# Altium footprint library ICs And Semiconductors SMD.PcbLib: 943 footprints (part 2 of 60)
Each footprint in its own frame and in the unit in brackets; x right, y up, seen from the top. Pads: shape width x height; smd on the part's side, far side on the other; paste and mask are expansions set on the pad; w line width, h text height; cw(c..) or ccw(c..) is an arc to the next point about the centre after c.
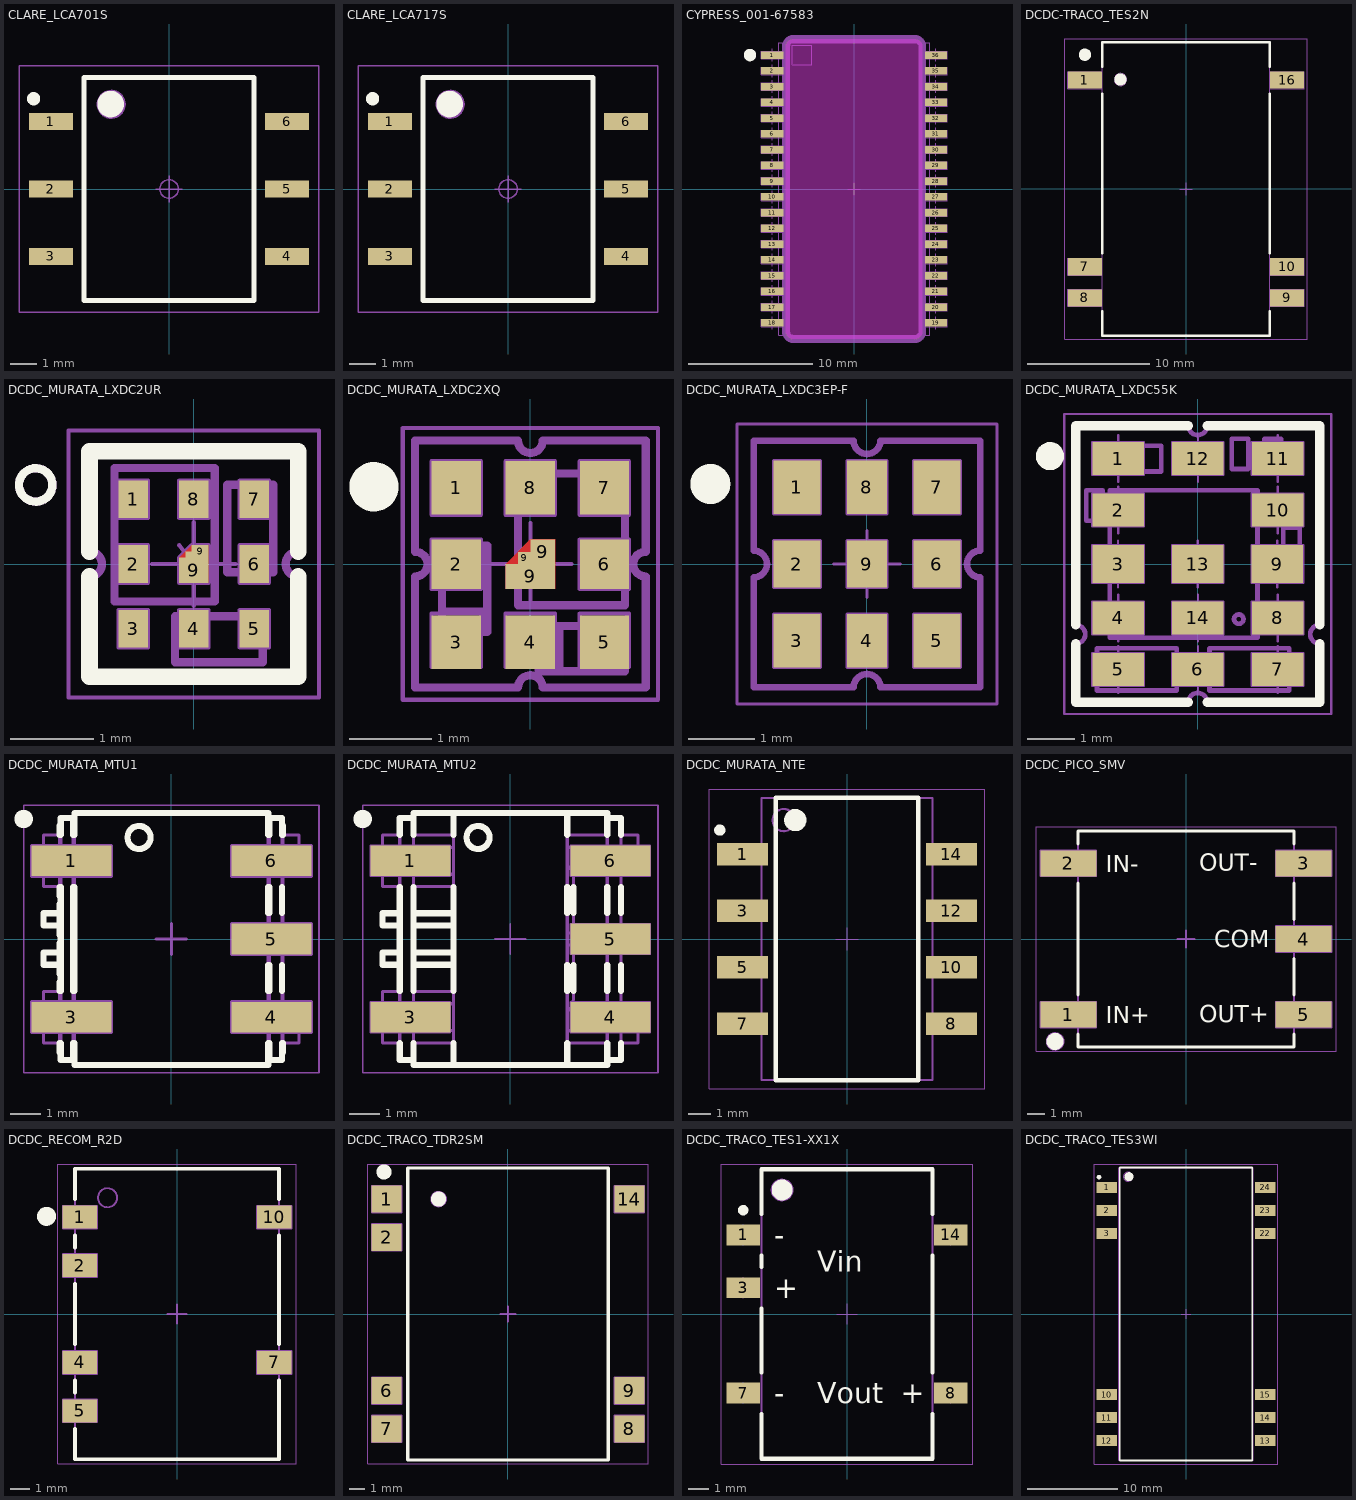
[diagram p1: the footprints below, top view; thin cyan lines are the x and y axes]

## CLARE_LCA701S [mm] "SOIC, 2.54mm, Pitch; 6 Pin, 6.35mm W X 8.382mm L X 4.699mm H body, CLARE LCA701S Serie"
height 4.69
pads (6):
  rect 1.65x0.65 smd: 1(-4.45,2.54) 2(-4.45,0) 3(-4.45,-2.54) 4(4.45,-2.54) 5(4.45,0) 6(4.45,2.54)
Top Overlay:
  circle w0.5: c-2.2,3.2 r0.25
  circle w0.25: c-5.1,3.4 r0.125
  lines w0.2: -3.2,-4.2 3.2,-4.2 3.2,4.2 -3.2,4.2 -3.2,-4.2
Mechanical 14:
  circle w0.1: c-2.175,3.191 r0.5
  lines w0.1: -3.175,-4.191 3.175,-4.191 3.175,4.191 -3.175,4.191 -3.175,-4.191
Mechanical 15:
  circle w0.05: c0,0 r0.35
  lines w0.05: -0.5,0 0.5,0 ; 0,-0.5 0,0.5 ; -5.65,-4.65 5.65,-4.65 5.65,4.65 -5.65,4.65 -5.65,-4.65
3D body "CLARE_LCA701S.stp": height 4.7, standoff 0, extent -5.052,-4.38 5.053,4.38

## CLARE_LCA717S [mm] "SOIC, 2.54mm, Pitch; 6 Pin, 6.35mm W X 8.382mm L X 4.699mm H body, CLARE LCA717S Serie"
height 4.69
pads (6):
  rect 1.65x0.65 smd: 1(-4.45,2.54) 2(-4.45,0) 3(-4.45,-2.54) 4(4.45,-2.54) 5(4.45,0) 6(4.45,2.54)
Top Overlay:
  circle w0.5: c-2.2,3.2 r0.25
  circle w0.25: c-5.1,3.4 r0.125
  lines w0.2: -3.2,-4.2 3.2,-4.2 3.2,4.2 -3.2,4.2 -3.2,-4.2
Mechanical 14:
  circle w0.1: c-2.175,3.191 r0.5
  lines w0.1: -3.175,-4.191 3.175,-4.191 3.175,4.191 -3.175,4.191 -3.175,-4.191
Mechanical 15:
  circle w0.05: c0,0 r0.35
  lines w0.05: -0.5,0 0.5,0 ; 0,-0.5 0,0.5 ; -5.65,-4.65 5.65,-4.65 5.65,4.65 -5.65,4.65 -5.65,-4.65
3D body "CLARE_LCA717S.stp": height 4.7, standoff 0, extent -5.052,-4.38 5.053,4.38

## CYPRESS_001-67583 [mm] "36-pin Ceramic Flat Pack (Solder Seal Lid) Package Outline 001-67583, Body 12.19mm X 23.37mm X 2.99mm H"
height 2.99
pads (36):
  rect 1.8x0.6 smd: 1(-6.6,10.795) 2(-6.6,9.525) 3(-6.6,8.255) 4(-6.6,6.985) 5(-6.6,5.715) 6(-6.6,4.445) 7(-6.6,3.175) 8(-6.6,1.905) 9(-6.6,0.635) 10(-6.6,-0.635) 11(-6.6,-1.905) 12(-6.6,-3.175) 13(-6.6,-4.445) 14(-6.6,-5.715) 15(-6.6,-6.985) 16(-6.6,-8.255) 17(-6.6,-9.525) 18(-6.6,-10.795) 19(6.6,-10.795) 20(6.6,-9.525) 21(6.6,-8.255) 22(6.6,-6.985) 23(6.6,-5.715) 24(6.6,-4.445) 25(6.6,-3.175) 26(6.6,-1.905) 27(6.6,-0.635) 28(6.6,0.635) 29(6.6,1.905) 30(6.6,3.175) 31(6.6,4.445) 32(6.6,5.715) 33(6.6,6.985) 34(6.6,8.255) 35(6.6,9.525) 36(6.6,10.795)
Top Overlay:
  circle w0.5: c-8.4,10.8 r0.25
Keep-Out Layer:
  board cut-out: -4.9,-12.1 -5.019,-12.1 -5.24,-12.009 -5.409,-11.84 -5.5,-11.619 -5.5,-11.5 -5.5,11.5 -5.5,11.619 -5.409,11.84 -5.24,12.009 -5.019,12.1 -4.9,12.1 4.9,12.1 5.019,12.1 5.24,12.009 5.409,11.84 5.5,11.619 5.5,11.5 5.5,-11.5 5.5,-11.619 5.409,-11.84 5.24,-12.009 5.019,-12.1 4.9,-12.1
Mechanical 1:
  lines w0.635: -5.5,-11.5 ccw(c-4.9,-11.5) -4.9,-12.1 4.9,-12.1 ccw(c4.9,-11.5) 5.5,-11.5 5.5,11.5 ccw(c4.9,11.5) 4.9,12.1 -4.9,12.1 ccw(c-4.9,11.5) -5.5,11.5 -5.5,-11.5
Mechanical 8:
  drawing of 292 lines, arcs and shapes, not listed
Mechanical 14:
  lines w0.1: -6.1,-11.8 6.1,-11.8 6.1,11.8 -6.1,11.8 -6.1,-11.8 ; -5,10.01 -5,11.61 -3.4,11.61 -3.4,10.01 -5,10.01
Drill Drawing:
  lines w0.1: -4.56,1.658 -5.5,2 ; -4.56,2.342 -5.5,2 ; -2.342,-11.16 -2,-12.1 ; -2.342,11.16 -2,12.1 ; -1.658,-11.16 -2,-12.1 ; -1.658,11.16 -2,12.1 ; -0.5,0 0,0 ; 0,-0.5 0,0 ; 0,0.5 0,0 ; 0.5,0 0,0 ; 1.115,-10.449 3.849,-10.449 5.3,-11.9 ; 4.394,-11.477 5.3,-11.9 ; 4.56,1.658 5.5,2 ; 4.56,2.342 5.5,2 ; 4.877,-10.994 5.3,-11.9 ; -5.5,2 5.5,2 ; -2,-12.1 -2,12.1 ; -5.5,-11.5 ccw(c-4.9,-11.5) -4.9,-12.1 4.9,-12.1 ccw(c4.9,-11.5) 5.5,-11.5 5.5,11.5 ccw(c4.9,11.5) 4.9,12.1 -4.9,12.1 ccw(c-4.9,11.5) -5.5,11.5 -5.5,-11.5
  text "11" at -0.516,2.209 h1
  text "24.2" at -2.209,2.903 h1
  text "r0.6" at 1.359,-10.239 h1
3D body "CYPRESS_001-67583.stp": height 2.5, standoff -0.49, extent -7,-11.81 7,11.81

## DCDC-TRACO_TES2N [mm] "TES 2 Series, DC/DC Converter,  Body 24x13.7mm"
height 8.25
pads (6):
  rect 2.8x1.4 smd: 1(-8.25,8.89) 7(-8.25,-6.35) 8(-8.25,-8.89) 9(8.25,-8.89) 10(8.25,-6.35) 16(8.25,8.89)
Top Overlay:
  circle w0.5: c-8.25,10.965 r0.25
  circle w0.5: c-5.35,8.94 r0.25
  lines w0.2: -6.85,-9.99 -6.85,-12 6.85,-12 6.85,-9.99 ; -6.85,-5.25 -6.85,7.79 ; -6.85,9.99 -6.85,12 6.85,12 6.85,9.99 ; 6.85,-5.25 6.85,7.79
Mechanical 8:
  lines w0.1: -8.75,-8.89 -8.25,-8.89 ; -8.75,-6.35 -8.25,-6.35 ; -8.75,8.89 -8.25,8.89 ; -8.25,-9.39 -8.25,-8.89 ; -8.25,-8.39 -8.25,-8.89 ; -8.25,-6.85 -8.25,-6.35 ; -8.25,-5.85 -8.25,-6.35 ; -8.25,8.39 -8.25,8.89 ; -8.25,9.39 -8.25,8.89 ; -7.75,-8.89 -8.25,-8.89 ; -7.75,-6.35 -8.25,-6.35 ; -7.75,8.89 -8.25,8.89 ; -0.5,0 0,0 ; 0,-0.5 0,0 ; 0,0.5 0,0 ; 0.5,0 0,0 ; 7.75,-8.89 8.25,-8.89 ; 7.75,-6.35 8.25,-6.35 ; 7.75,8.89 8.25,8.89 ; 8.25,-9.39 8.25,-8.89 ; 8.25,-8.39 8.25,-8.89 ; 8.25,-6.85 8.25,-6.35 ; 8.25,-5.85 8.25,-6.35 ; 8.25,8.39 8.25,8.89 ; 8.25,9.39 8.25,8.89 ; 8.75,-8.89 8.25,-8.89 ; 8.75,-6.35 8.25,-6.35 ; 8.75,8.89 8.25,8.89 ; -9.65,-9.59 -9.65,-8.19 -6.85,-8.19 -6.85,-9.59 -9.65,-9.59 ; -9.65,-7.05 -9.65,-5.65 -6.85,-5.65 -6.85,-7.05 -9.65,-7.05 ; -9.65,8.19 -9.65,9.59 -6.85,9.59 -6.85,8.19 -9.65,8.19 ; 6.85,-9.59 6.85,-8.19 9.65,-8.19 9.65,-9.59 6.85,-9.59 ; 6.85,-7.05 6.85,-5.65 9.65,-5.65 9.65,-7.05 6.85,-7.05 ; 6.85,8.19 6.85,9.59 9.65,9.59 9.65,8.19 6.85,8.19
Mechanical 14:
  circle w0.1: c-5.35,8.94 r0.5
  lines w0.1: -6.85,-9.39 -9.05,-9.39 -9.05,-8.39 -6.85,-8.39 ; -6.85,-6.85 -9.05,-6.85 -9.05,-5.85 -6.85,-5.85 ; -6.85,8.39 -9.05,8.39 -9.05,9.39 -6.85,9.39 ; 6.85,-9.39 9.05,-9.39 9.05,-8.39 6.85,-8.39 ; 6.85,-6.85 9.05,-6.85 9.05,-5.85 6.85,-5.85 ; 6.85,8.39 9.05,8.39 9.05,9.39 6.85,9.39 ; -6.85,-12 -6.85,12 6.85,12 6.85,-12 -6.85,-12
Mechanical 15:
  lines w0.05: -9.9,-12.25 -9.9,12.25 9.9,12.25 9.9,-12.25 -9.9,-12.25
3D body "DCDC-TRACO_TES2N.stp": height 8.45, standoff 0, extent -9.05,-12 9.05,12

## DCDC_MURATA_LXDC2UR [mm] "LGA, 9-Pin, Body 2.3mm x2.5mm, MURATA LXDC2UR Series"
height 1.2
pads (11):
  rect 0.35x0.45 smd: 1(-0.725,0.775) 2(-0.725,0) 3(-0.725,-0.775) 4(0,-0.775) 5(0.725,-0.775) 6(0.725,0) 7(0.725,0.775) 8(0,0.775)
  rect 0.075x0.075 smd: 9(-0.062,0.112)
  rect 0.35x0.3 smd: 9(0,-0.075)
  rect 0.2x0.15 smd: 9(0.075,0.15)
Top Layer:
  region: -0.175,0.075 -0.025,0.225 0.175,0.225 0.175,-0.225 -0.175,-0.225
Top Overlay:
  circle w0.1: c-1.894,0.947 r0.2
  lines w0.2: -1.25,-0.15 -1.25,-1.35 1.25,-1.35 1.25,-0.15 ; -1.25,0.15 -1.25,1.35 1.25,1.35 1.25,0.15
Mechanical 8:
  lines w0.05: -0.5,0 0,0 ; -0.175,0.225 0,0 ; -0.1,0.075 -0.1,0.15 -0.025,0.15 -0.062,0.112 -0.025,0.075 -0.025,0.225 ; 0,-0.5 0,0 ; 0,0.5 0,0 ; 0.5,0 0,0 ; -0.9,-1 -0.55,-1 -0.55,-0.55 -0.9,-0.55 ; -0.9,-1 -0.9,-0.55 ; -0.9,-1 -0.725,-0.775 -0.9,-0.55 ; -0.9,-0.225 -0.55,-0.225 -0.55,0.225 -0.9,0.225 ; -0.9,-0.225 -0.9,0.225 ; -0.9,-0.225 -0.725,0 -0.9,0.225 ; -0.9,0.55 -0.55,0.55 -0.55,1 -0.9,1 ; -0.9,0.55 -0.9,1 ; -0.9,0.55 -0.725,0.775 -0.9,1 ; -0.175,-1 0.175,-1 0.175,-0.55 -0.175,-0.55 ; -0.175,-1 -0.175,-0.55 ; -0.175,-1 0,-0.775 -0.175,-0.55 ; -0.175,-0.225 0.175,-0.225 ; -0.175,-0.225 -0.175,0.075 ; -0.175,-0.225 0,0 ; -0.175,0.075 -0.025,0.225 ; -0.175,0.075 0.175,0.075 ; -0.175,0.55 0.175,0.55 0.175,1 -0.175,1 ; -0.175,0.55 -0.175,1 ; -0.175,0.55 0,0.775 -0.175,1 ; -0.025,0.225 0.175,0.225 ; 0.175,-0.225 0.175,0.225 ; 0.175,-0.225 0,-0.075 0.175,0.075 ; 0.175,0.075 0.075,0.15 0.175,0.225 ; 0.55,-1 0.9,-1 0.9,-0.55 0.55,-0.55 ; 0.55,-1 0.55,-0.55 ; 0.55,-1 0.725,-0.775 0.55,-0.55 ; 0.55,-0.225 0.9,-0.225 0.9,0.225 0.55,0.225 ; 0.55,-0.225 0.55,0.225 ; 0.55,-0.225 0.725,0 0.55,0.225 ; 0.55,0.55 0.9,0.55 0.9,1 0.55,1 ; 0.55,0.55 0.55,1 ; 0.55,0.55 0.725,0.775 0.55,1
Mechanical 14:
  circle w0.1: c-1.894,0.947 r0.2
  lines w0.1: -1.25,-1.35 -1.25,-0.15 ccw(c-1.25,0) -1.25,0.15 -1.25,1.35 1.25,1.35 1.25,0.15 ccw(c1.25,0) 1.25,-0.15 1.25,-1.35 -1.25,-1.35 ; -0.95,-0.45 -0.95,1.15 0.25,1.15 0.25,-0.45 -0.95,-0.45 ; -0.225,-1.175 0.825,-1.175 0.825,-0.625 -0.225,-0.625 -0.225,-1.175 ; 0.4,-0.1 0.95,-0.1 0.95,0.95 0.4,0.95 0.4,-0.1
Mechanical 15:
  lines w0.05: -1.5,-1.6 1.5,-1.6 1.5,1.6 -1.5,1.6 -1.5,-1.6
3D body "DCDC_MURATA_LXDC2UR.stp": height 1.2, standoff 0, extent -1.25,-1.35 1.25,1.35

## DCDC_MURATA_LXDC2XQ [mm] "LGA, 9-Pin, Body 2.8mm x 2.6mm, MURATA LXDC2XQ Series"
height 1.14
pads (11):
  rect 0.6x0.65 smd: 1(-0.9,0.925) 3(-0.9,-0.95) 4(0,-0.95) 5(0.9,-0.95) 7(0.9,0.925) 8(0,0.925)
  rect 0.6x0.6 smd: 2(-0.9,0) 6(0.9,0)
  rect 0.15x0.15 smd: 9(-0.075,0.075)
  rect 0.6x0.3 smd: 9(0,-0.15)
  rect 0.3x0.3 smd: 9(0.15,0.15)
Top Layer:
  region: -0.3,-0.3 -0.3,0 0,0.3 0.3,0.3 0.3,-0.3
Top Overlay:
  circle w0.3: c-1.9,0.94 r0.15
Mechanical 8:
  lines w0.05: -0.5,0 0,0 ; 0,-0.5 0,0 ; 0,0.5 0,0 ; 0.5,0 0,0 ; -1.2,-1.25 -1.2,-0.6 -0.6,-0.6 -0.6,-1.25 ; -1.2,-1.25 -0.6,-1.25 ; -1.2,-1.25 -0.9,-0.925 -0.6,-1.25 ; -1.2,-0.3 -1.2,0.3 ; -1.2,-0.3 -0.6,-0.3 -0.6,0.3 -1.2,0.3 ; -1.2,-0.3 -0.9,0 -1.2,0.3 ; -1.2,1.25 -0.9,0.925 -0.6,1.25 ; -1.2,1.25 -0.6,1.25 ; -1.2,1.25 -1.2,0.6 -0.6,0.6 -0.6,1.25 ; -0.3,-1.25 -0.3,-0.6 0.3,-0.6 0.3,-1.25 ; -0.3,-1.25 0.3,-1.25 ; -0.3,-1.25 0,-0.925 0.3,-1.25 ; -0.3,1.25 0.3,1.25 ; -0.3,1.25 -0.3,0.6 0.3,0.6 0.3,1.25 ; -0.3,1.25 0,0.925 0.3,1.25 ; 0.6,1.25 1.2,1.25 ; 0.6,1.25 0.6,0.6 1.2,0.6 1.2,1.25 ; 0.6,1.25 0.9,0.925 1.2,1.25 ; 1.2,-1.25 0.9,-0.925 1.2,-0.6 ; 1.2,-1.25 0.6,-1.25 0.6,-0.6 1.2,-0.6 ; 1.2,-1.25 1.2,-0.6 ; 1.2,-0.3 0.9,0 1.2,0.3 ; 1.2,-0.3 0.6,-0.3 0.6,0.3 1.2,0.3 ; 1.2,-0.3 1.2,0.3
Mechanical 14:
  circle w0.1: c-1.894,0.947 r0.2
  lines w0.1: -1.075,-0.575 -0.525,-0.575 ; -1.075,-0.025 -0.525,-0.025 ; 0.35,-1.3 0.35,-0.75 ; 0.9,-1.3 0.9,-0.75 ; -1.4,-1.5 -0.15,-1.5 cw(c0,-1.5) 0.15,-1.5 1.4,-1.5 1.4,-0.15 cw(c1.4,0) 1.4,0.15 1.4,1.5 0.15,1.5 cw(c0,1.5) -0.15,1.5 -1.4,1.5 -1.4,0.15 cw(c-1.4,0) -1.4,-0.15 -1.4,-1.5 ; -1.075,-0.825 -0.525,-0.825 -0.525,0.225 -1.075,0.225 -1.075,-0.825 ; -0.15,-0.5 1.15,-0.5 1.15,1.1 -0.15,1.1 -0.15,-0.5 ; 0.1,-1.3 0.1,-0.75 1.15,-0.75 1.15,-1.3 0.1,-1.3
Mechanical 15:
  lines w0.05: -1.55,-1.647 -1.55,1.653 1.55,1.653 1.55,-1.647 -1.55,-1.647
3D body "DCDC_MURATA_LXDC2XQ.stp": height 1.15, standoff 0, extent -1.4,-1.5 1.4,1.5

## DCDC_MURATA_LXDC3EP-F [mm] "LGA, 9-Pin, Body 3.2mm x 3.5mm, MURATA LXDC3EP Type F Series"
height 1.3
pads (9):
  rect 0.7x0.8 smd: 1(-1.05,1.15) 3(-1.05,-1.15) 5(1.05,-1.15) 7(1.05,1.15)
  rect 0.7x0.7 smd: 2(-1.05,0) 6(1.05,0)
  rect 0.6x0.8 smd: 4(0,-1.15) 8(0,1.15)
  rect 0.6x0.7 smd: 9(0,0)
Top Overlay:
  circle w0.3: c-2.35,1.2 r0.15
Mechanical 8:
  lines w0.05: -0.5,0 0,0 ; 0,-0.5 0,0 ; 0,0.5 0,0 ; 0.5,0 0,0 ; -1.4,-1.55 -1.05,-1.15 -0.7,-1.55 ; -1.4,-1.55 -1.4,-0.75 -0.7,-0.75 -0.7,-1.55 ; -1.4,-1.55 -0.7,-1.55 ; -1.4,-0.35 -1.05,0 -1.4,0.35 ; -1.4,-0.35 -0.7,-0.35 -0.7,0.35 -1.4,0.35 ; -1.4,-0.35 -1.4,0.35 ; -1.4,1.55 -1.05,1.15 -0.7,1.55 ; -1.4,1.55 -0.7,1.55 ; -1.4,1.55 -1.4,0.75 -0.7,0.75 -0.7,1.55 ; -0.3,-1.55 0,-1.15 0.3,-1.55 ; -0.3,-1.55 -0.3,-0.75 0.3,-0.75 0.3,-1.55 ; -0.3,-1.55 0.3,-1.55 ; -0.3,-0.35 0,0 ; -0.3,-0.35 -0.3,0.35 ; -0.3,-0.35 0.3,-0.35 0.3,0.35 -0.3,0.35 ; -0.3,0.35 0,0 ; -0.3,1.55 0,1.15 0.3,1.55 ; -0.3,1.55 -0.3,0.75 0.3,0.75 0.3,1.55 ; -0.3,1.55 0.3,1.55 ; 0.7,-1.55 1.05,-1.15 1.4,-1.55 ; 0.7,-1.55 0.7,-0.75 1.4,-0.75 1.4,-1.55 ; 0.7,-1.55 1.4,-1.55 ; 0.7,1.55 1.05,1.15 1.4,1.55 ; 0.7,1.55 1.4,1.55 ; 0.7,1.55 0.7,0.75 1.4,0.75 1.4,1.55 ; 1.4,-0.35 1.05,0 1.4,0.35 ; 1.4,-0.35 0.7,-0.35 0.7,0.35 1.4,0.35 ; 1.4,-0.35 1.4,0.35
Mechanical 14:
  circle w0.1: c-2.35,1.2 r0.2
  lines w0.1: -1.7,-1.85 -0.2,-1.85 cw(c0,-1.85) 0.2,-1.85 1.7,-1.85 1.7,-0.2 cw(c1.7,0) 1.7,0.2 1.7,1.85 0.2,1.85 cw(c0,1.85) -0.2,1.85 -1.7,1.85 -1.7,0.2 cw(c-1.7,0) -1.7,-0.2 -1.7,-1.85
Mechanical 15:
  lines w0.05: -1.95,-2.1 1.95,-2.1 1.95,2.1 -1.95,2.1 -1.95,-2.1
3D body "DCDC_MURATA_LXDC3EP18F-F.stp": height 1.3, standoff 0, extent -1.7,-1.85 1.7,1.85

## DCDC_MURATA_LXDC55K [mm] "LGA, 14-Pin, Body 5.0mm x 5.7mm, MURATA LXDC55K Series"
height 2.1
pads (14):
  rect 1.1x0.7 smd: 1(-1.695,2.25) 2(-1.695,1.15) 4(-1.695,-1.15) 5(-1.695,-2.25) 6(0.005,-2.25) 7(1.705,-2.25) 8(1.705,-1.15) 10(1.705,1.15) 11(1.705,2.25) 12(0.005,2.25) 14(0.005,-1.15)
  rect 1.1x0.8 smd: 3(-1.7,0) 9(1.7,0) 13(0,0)
Top Overlay:
  circle w0.3: c-3.15,2.3 r0.15
  lines w0.2: -2.6,-1.7 -2.6,-2.95 -0.2,-2.95 ; -2.6,-1.3 -2.6,2.95 -0.2,2.95 ; 0.2,-2.95 2.6,-2.95 2.6,-1.7 ; 0.2,2.95 2.6,2.95 2.6,-1.3
Mechanical 8:
  lines w0.05: -2.2,0 -1.7,0 ; -2.195,-2.25 -1.695,-2.25 ; -2.195,-1.15 -1.695,-1.15 ; -2.195,1.15 -1.695,1.15 ; -2.195,2.25 -1.695,2.25 ; -1.7,-0.5 -1.7,0 ; -1.7,0.5 -1.7,0 ; -1.695,-2.75 -1.695,-2.25 ; -1.695,-1.75 -1.695,-2.25 ; -1.695,-1.65 -1.695,-1.15 ; -1.695,-0.65 -1.695,-1.15 ; -1.695,0.65 -1.695,1.15 ; -1.695,1.65 -1.695,1.15 ; -1.695,1.75 -1.695,2.25 ; -1.695,2.75 -1.695,2.25 ; -1.2,0 -1.7,0 ; -1.195,-2.25 -1.695,-2.25 ; -1.195,-1.15 -1.695,-1.15 ; -1.195,1.15 -1.695,1.15 ; -1.195,2.25 -1.695,2.25 ; -0.495,-2.25 0.005,-2.25 ; -0.495,-1.15 0.005,-1.15 ; -0.495,2.25 0.005,2.25 ; 0.005,-2.75 0.005,-2.25 ; 0.005,-1.75 0.005,-2.25 ; 0.005,-1.65 0.005,-1.15 ; 0.005,-0.65 0.005,-1.15 ; 0.005,1.75 0.005,2.25 ; 0.005,2.75 0.005,2.25 ; 0.505,-2.25 0.005,-2.25 ; 0.505,-1.15 0.005,-1.15 ; 0.505,2.25 0.005,2.25 ; 1.2,0 1.7,0 ; 1.205,-2.25 1.705,-2.25 ; 1.205,-1.15 1.705,-1.15 ; 1.205,1.15 1.705,1.15 ; 1.205,2.25 1.705,2.25 ; 1.7,-0.5 1.7,0 ; 1.7,0.5 1.7,0 ; 1.705,-2.75 1.705,-2.25 ; 1.705,-1.75 1.705,-2.25 ; 1.705,-1.65 1.705,-1.15 ; 1.705,-0.65 1.705,-1.15 ; 1.705,0.65 1.705,1.15 ; 1.705,1.65 1.705,1.15 ; 1.705,1.75 1.705,2.25 ; 1.705,2.75 1.705,2.25 ; 2.2,0 1.7,0 ; 2.205,-2.25 1.705,-2.25 ; 2.205,-1.15 1.705,-1.15 ; 2.205,1.15 1.705,1.15 ; 2.205,2.25 1.705,2.25 ; 0,0 0,-0.5 0,0 ; 0,0 -0.5,0 0,0 ; 0,0 0.5,0 0,0 ; 0,0 0,0.5 0,0 ; -2.25,-2.6 -2.25,-1.9 -1.15,-1.9 -1.15,-2.6 -2.25,-2.6 ; -2.25,-1.5 -2.25,-0.8 -1.15,-0.8 -1.15,-1.5 -2.25,-1.5 ; -2.25,-0.4 -1.15,-0.4 -1.15,0.4 -2.25,0.4 -2.25,-0.4 ; -2.25,0.8 -2.25,1.5 -1.15,1.5 -1.15,0.8 -2.25,0.8 ; -2.25,1.9 -2.25,2.6 -1.15,2.6 -1.15,1.9 -2.25,1.9 ; -0.55,-2.6 -0.55,-1.9 0.55,-1.9 0.55,-2.6 -0.55,-2.6 ; -0.55,-1.5 -0.55,-0.8 0.55,-0.8 0.55,-1.5 -0.55,-1.5 ; -0.55,-0.4 0.55,-0.4 0.55,0.4 -0.55,0.4 -0.55,-0.4 ; -0.55,1.9 -0.55,2.6 0.55,2.6 0.55,1.9 -0.55,1.9 ; 1.15,-2.6 1.15,-1.9 2.25,-1.9 2.25,-2.6 1.15,-2.6 ; 1.15,-1.5 1.15,-0.8 2.25,-0.8 2.25,-1.5 1.15,-1.5 ; 1.15,-0.4 2.25,-0.4 2.25,0.4 1.15,0.4 1.15,-0.4 ; 1.15,0.8 1.15,1.5 2.25,1.5 2.25,0.8 1.15,0.8 ; 1.15,1.9 1.15,2.6 2.25,2.6 2.25,1.9 1.15,1.9
Mechanical 14:
  circle w0.1: c-3.15,2.3 r0.2
  circle w0.1: c0.875,-1.175 r0.1
  lines w0.1: -2.6,-2.95 -0.2,-2.95 cw(c0,-2.95) 0.2,-2.95 2.6,-2.95 2.6,-1.7 cw(c2.6,-1.5) 2.6,-1.3 2.6,2.95 0.2,2.95 cw(c0,2.95) -0.2,2.95 -2.6,2.95 -2.6,-1.3 cw(c-2.6,-1.5) -2.6,-1.7 -2.6,-2.95 ; -2.375,0.925 -2.025,0.925 -2.025,1.575 -2.375,1.575 -2.375,0.925 ; -2.15,-2.7 -0.45,-2.7 -0.45,-1.8 -2.15,-1.8 -2.15,-2.7 ; -1.875,-1.575 1.275,-1.575 1.275,1.575 -1.875,1.575 -1.875,-1.575 ; -1.825,1.975 -0.775,1.975 -0.775,2.525 -1.825,2.525 -1.825,1.975 ; 0.25,-2.7 1.95,-2.7 1.95,-1.8 0.25,-1.8 0.25,-2.7 ; 0.725,2.025 0.725,2.675 1.075,2.675 1.075,2.025 0.725,2.025 ; 1.425,2.025 1.425,2.675 1.775,2.675 1.775,2.025 1.425,2.025 ; 1.52,1.13 2.175,1.13 2.17,1.48 1.52,1.48 1.52,1.13 ; 1.825,0.125 2.175,0.125 2.175,0.775 1.825,0.775 1.825,0.125
Mechanical 15:
  lines w0.05: -2.85,-3.2 2.85,-3.2 2.85,3.2 -2.85,3.2 -2.85,-3.2
3D body "DCDC_MURATA_LXDC55K.stp": height 2.1, standoff 0, extent -2.6,-2.95 2.6,2.95

## DCDC_MURATA_MTU1 [mm] "MTU1 Series, Body 8.2 x 8.4, Height 8.5mm"
height 8.5
pads (5):
  rect 2.6x1 smd: 1(-3.25,2.54) 3(-3.25,-2.54) 4(3.25,-2.54) 5(3.25,0) 6(3.25,2.54)
Top Overlay:
  circle w0.3: c-4.8,3.9 r0.15
  circle w0.2: c-1.05,3.3 r0.375
  lines w0.2: -3.634,-3.39 -3.634,-3.683 -3.592,-3.683 ; -3.634,-1.69 -3.634,-1.397 -3.592,-1.397 ; -3.634,-0.835 -4.15,-0.835 -4.15,-0.435 -3.634,-0.435 ; -3.634,0.435 -4.15,0.435 -4.15,0.835 -3.634,0.835 ; -3.634,1.69 -3.634,1.397 -3.592,1.397 ; -3.634,3.39 -3.634,3.683 -3.592,3.683 ; -3.592,-3.39 -3.592,-3.937 -3.192,-3.937 -3.192,-3.39 ; -3.592,-1.69 -3.592,1.69 ; -3.592,-1.143 -3.634,-1.143 -3.634,-0.127 -3.592,-0.127 ; -3.592,0.127 -3.634,0.127 -3.634,1.143 -3.592,1.143 ; -3.592,3.39 -3.592,3.937 -3.192,3.937 -3.192,3.39 ; -3.192,-1.69 -3.192,1.69 ; -3.15,-3.39 -3.15,-4.1 3.15,-4.1 3.15,-3.39 ; -3.15,-1.69 -3.15,1.69 ; -3.15,3.39 -3.15,4.1 3.15,4.1 3.15,3.39 ; 3.15,-1.69 3.15,-0.85 ; 3.15,0.85 3.15,1.69 ; 3.192,-3.39 3.192,-3.937 3.592,-3.937 3.592,-3.39 ; 3.192,-1.69 3.192,-0.85 ; 3.192,0.85 3.192,1.69 ; 3.192,3.39 3.192,3.937 3.592,3.937 3.592,3.39 ; 3.592,-3.683 3.634,-3.683 3.634,-3.39 ; 3.592,-1.69 3.592,-0.85 ; 3.592,0.85 3.592,1.69 ; 3.592,3.683 3.634,3.683 3.634,3.39
Mechanical 8:
  lines w0.05: -4.55,-2.04 -1.95,-2.04 ; -4.55,2.04 -1.95,2.04 ; -4.55,3.04 -1.95,3.04 ; 1.95,-3.04 4.55,-3.04 ; 1.95,-2.04 4.55,-2.04 ; 1.95,-0.5 4.55,-0.5 ; 1.95,0.5 4.55,0.5 ; 1.95,2.04 4.55,2.04 ; 1.95,3.04 4.55,3.04
  lines w0.1: -3.75,-2.54 -3.25,-2.54 ; -3.75,2.54 -3.25,2.54 ; -3.25,-3.04 -3.25,-2.54 ; -3.25,-2.04 -3.25,-2.54 ; -3.25,2.04 -3.25,2.54 ; -3.25,3.04 -3.25,2.54 ; -2.75,-2.54 -3.25,-2.54 ; -2.75,2.54 -3.25,2.54 ; 2.75,-2.54 3.25,-2.54 ; 2.75,0 3.25,0 ; 2.75,2.54 3.25,2.54 ; 3.25,-3.04 3.25,-2.54 ; 3.25,-2.04 3.25,-2.54 ; 3.25,-0.5 3.25,0 ; 3.25,0.5 3.25,0 ; 3.25,2.04 3.25,2.54 ; 3.25,3.04 3.25,2.54 ; 3.75,-2.54 3.25,-2.54 ; 3.75,0 3.25,0 ; 3.75,2.54 3.25,2.54 ; 0,0 0,0.5 0,0 ; 0,0 0.5,0 0,0 ; 0,0 -0.5,0 0,0 ; 0,0 0,-0.5 0,0 ; -4.55,-3.04 -1.95,-3.04 -1.95,-2.04 -4.55,-2.04 -4.55,-3.04 ; -4.55,2.04 -1.95,2.04 -1.95,3.04 -4.55,3.04 -4.55,2.04 ; 1.95,-3.04 4.55,-3.04 4.55,-2.04 1.95,-2.04 1.95,-3.04 ; 1.95,-0.5 1.95,0.5 4.55,0.5 4.55,-0.5 1.95,-0.5 ; 1.95,2.04 4.55,2.04 4.55,3.04 1.95,3.04 1.95,2.04
Mechanical 14:
  circle w0.1: c-1.05,3.3 r0.375
  lines w0.1: -3.634,-3.375 -4.15,-3.375 -4.15,-2.975 -3.634,-2.975 ; -3.634,-2.84 -4.2,-2.84 -4.2,-2.24 -3.634,-2.24 ; -3.634,-2.74 -4.13,-2.74 -4.13,-2.34 -3.634,-2.34 ; -3.634,-2.105 -4.15,-2.105 -4.15,-1.705 -3.634,-1.705 ; -3.634,-0.835 -4.15,-0.835 -4.15,-0.435 -3.634,-0.435 ; -3.634,0.435 -4.15,0.435 -4.15,0.835 -3.634,0.835 ; -3.634,1.705 -4.15,1.705 -4.15,2.105 -3.634,2.105 ; -3.634,2.24 -4.2,2.24 -4.2,2.84 -3.634,2.84 ; -3.634,2.74 -4.13,2.74 -4.13,2.34 -3.63,2.34 ; -3.634,2.975 -4.15,2.975 -4.15,3.375 -3.634,3.375 ; -3.592,-3.683 -3.634,-3.683 -3.634,-1.397 -3.592,-1.397 ; -3.592,-1.143 -3.634,-1.143 -3.634,-0.127 -3.592,-0.127 ; -3.592,0.127 -3.634,0.127 -3.634,1.143 -3.592,1.143 ; -3.592,1.397 -3.634,1.397 -3.634,3.683 -3.592,3.683 ; 3.592,-3.683 3.634,-3.683 3.634,-1.778 3.592,-1.778 ; 3.592,-0.762 3.634,-0.762 3.634,0.762 3.592,0.762 ; 3.592,1.778 3.634,1.778 3.634,3.683 3.592,3.683 ; 3.63,-2.34 4.13,-2.34 4.13,-2.74 3.634,-2.74 ; 3.63,-0.2 4.15,-0.2 4.15,0.2 3.63,0.2 ; 3.63,2.74 4.13,2.74 4.13,2.34 3.634,2.34 ; 3.634,-3.375 4.15,-3.375 4.15,-2.975 3.634,-2.975 ; 3.634,-2.84 4.2,-2.84 4.2,-2.24 3.634,-2.24 ; 3.634,-0.3 4.2,-0.3 4.2,0.3 3.634,0.297 ; 3.634,2.24 4.2,2.24 4.2,2.84 3.634,2.84 ; 3.634,2.975 4.15,2.975 4.15,3.375 3.634,3.375 ; -3.592,-3.937 -3.592,3.937 -3.192,3.937 -3.192,-3.937 -3.592,-3.937 ; -3.15,-4.1 3.15,-4.1 3.15,4.1 -3.15,4.1 -3.15,-4.1 ; 3.192,-3.937 3.592,-3.937 3.592,3.937 3.192,3.937 3.192,-3.937
Mechanical 15:
  lines w0.05: -4.8,-4.35 4.8,-4.35 4.8,4.35 -4.8,4.35 -4.8,-4.35
3D body "DCDC_MURATA_MTU1.stp": height 8.5, standoff 0, extent -4.2,-4.1 4.2,4.1

## DCDC_MURATA_MTU2 [mm] "MTU2 Series, Body 8.2 x 8.4, Height 8.5mm"
height 8.5
pads (5):
  rect 2.6x1 smd: 1(-3.25,2.54) 3(-3.25,-2.54) 4(3.25,-2.54) 5(3.25,0) 6(3.25,2.54)
Top Overlay:
  circle w0.2: c-1.05,3.3 r0.375
  circle w0.3: c-4.8,3.9 r0.15
  lines w0.2: -3.592,-3.39 -3.592,-3.937 -3.15,-3.937 ; -3.592,-1.69 -3.592,1.69 ; -3.592,-0.835 -4.15,-0.835 -4.15,-0.435 -3.592,-0.435 ; -3.592,0.435 -4.15,0.435 -4.15,0.835 -3.592,0.835 ; -3.592,3.39 -3.592,3.937 -3.15,3.937 ; -3.15,-3.39 -3.15,-4.1 3.15,-4.1 3.15,-3.39 ; -3.15,-1.69 -3.15,1.69 ; -3.15,-0.835 -1.85,-0.835 ; -3.15,-0.435 -1.85,-0.435 ; -3.15,0.435 -1.85,0.435 ; -3.15,0.835 -1.85,0.835 ; -3.15,3.39 -3.15,4.1 3.15,4.1 3.15,3.39 ; -1.85,-4.1 -1.85,-3.39 ; -1.85,-1.69 -1.85,1.69 ; -1.85,3.39 -1.85,4.1 ; 1.85,-4.1 1.85,-3.39 ; 1.85,-1.69 1.85,-0.85 ; 1.85,0.85 1.85,1.69 ; 1.85,3.39 1.85,4.1 ; 2.05,-1.69 2.05,-0.85 ; 2.05,0.85 2.05,1.69 ; 3.15,-3.937 3.592,-3.937 3.592,-3.39 ; 3.15,-1.69 3.15,-0.85 ; 3.15,0.85 3.15,1.69 ; 3.15,3.937 3.592,3.937 3.592,3.39 ; 3.592,-1.69 3.592,-0.85 ; 3.592,0.85 3.592,1.69
Mechanical 8:
  lines w0.05: -3.75,-2.54 -3.25,-2.54 ; -3.75,2.54 -3.25,2.54 ; -3.25,-3.04 -3.25,-2.54 ; -3.25,-2.04 -3.25,-2.54 ; -3.25,2.04 -3.25,2.54 ; -3.25,3.04 -3.25,2.54 ; -2.75,-2.54 -3.25,-2.54 ; -2.75,2.54 -3.25,2.54 ; -0.5,0 0,0 ; 0,-0.5 0,0 ; 0,0.5 0,0 ; 0.5,0 0,0 ; 2.75,-2.54 3.25,-2.54 ; 2.75,0 3.25,0 ; 2.75,2.54 3.25,2.54 ; 3.25,-3.04 3.25,-2.54 ; 3.25,-2.04 3.25,-2.54 ; 3.25,-0.5 3.25,0 ; 3.25,0.5 3.25,0 ; 3.25,2.04 3.25,2.54 ; 3.25,3.04 3.25,2.54 ; 3.75,-2.54 3.25,-2.54 ; 3.75,0 3.25,0 ; 3.75,2.54 3.25,2.54 ; -4.55,-3.04 -4.55,-2.04 -1.95,-2.04 -1.95,-3.04 -4.55,-3.04 ; -4.55,2.04 -1.95,2.04 -1.95,3.04 -4.55,3.04 -4.55,2.04 ; 1.95,-3.04 1.95,-2.04 4.55,-2.04 4.55,-3.04 1.95,-3.04 ; 1.95,-0.5 1.95,0.5 4.55,0.5 4.55,-0.5 1.95,-0.5 ; 1.95,2.04 1.95,3.04 4.55,3.04 4.55,2.04 1.95,2.04
Mechanical 14:
  circle w0.1: c-1.05,3.3 r0.375
  lines w0.1: -3.592,-3.375 -4.15,-3.375 -4.15,-2.975 -3.592,-2.975 ; -3.592,-2.84 -4.2,-2.84 -4.2,-2.24 -3.592,-2.24 ; -3.592,-2.105 -4.15,-2.105 -4.15,-1.705 -3.592,-1.705 ; -3.592,-0.835 -4.15,-0.835 -4.15,-0.435 -3.592,-0.435 ; -3.592,0.435 -4.15,0.435 -4.15,0.835 -3.592,0.835 ; -3.592,1.705 -4.15,1.705 -4.15,2.105 -3.592,2.105 ; -3.592,2.24 -4.2,2.24 -4.2,2.84 -3.592,2.84 ; -3.592,2.975 -4.15,2.975 -4.15,3.375 -3.592,3.375 ; -3.15,-3.937 -3.592,-3.937 -3.592,3.937 -3.15,3.937 ; -3.15,-3.375 -1.85,-3.375 ; -3.15,-2.975 -1.85,-2.975 ; -3.15,-2.105 -1.85,-2.105 ; -3.15,-1.705 -1.85,-1.705 ; -3.15,-0.835 -1.85,-0.835 ; -3.15,-0.435 -1.85,-0.435 ; -3.15,0.435 -1.85,0.435 ; -3.15,0.835 -1.85,0.835 ; -3.15,1.705 -1.85,1.705 ; -3.15,2.105 -1.85,2.105 ; -3.15,2.975 -1.85,2.975 ; -3.15,3.375 -1.85,3.375 ; -1.85,-4.1 -1.85,4.1 ; 1.85,-4.1 1.85,4.1 ; 1.85,-3.375 3.15,-3.375 ; 1.85,-2.975 3.15,-2.975 ; 1.85,-2.353 ccw(c1.55,-1.953) 2.05,-1.953 2.05,-0.2 ; 1.85,-0.2 3.15,-0.2 ; 1.85,0.2 3.15,0.2 ; 1.85,2.377 cw(c1.55,1.977) 2.05,1.977 2.05,0.2 ; 1.85,2.975 3.15,2.975 ; 1.85,3.375 3.15,3.375 ; 3.15,-3.937 3.592,-3.937 3.592,3.937 3.15,3.937 ; 3.592,-3.375 4.15,-3.375 4.15,-2.975 3.592,-2.975 ; 3.592,-2.84 4.2,-2.84 4.2,-2.24 3.592,-2.24 ; 3.592,-0.3 4.2,-0.3 4.2,0.3 3.592,0.3 ; 3.592,2.24 4.2,2.24 4.2,2.84 3.592,2.84 ; 3.592,2.975 4.15,2.975 4.15,3.375 3.592,3.375 ; -3.15,-4.1 -3.15,4.1 3.15,4.1 3.15,-4.1 -3.15,-4.1
Mechanical 15:
  lines w0.05: -4.8,-4.35 4.8,-4.35 4.8,4.35 -4.8,4.35 -4.8,-4.35
3D body "DCDC_MURATA_MTU2.stp": height 8.5, standoff 0, extent -4.2,-4.1 4.2,4.1

## DCDC_MURATA_NTE [mm] "SOIC, 2.54mm,pitch; 8 pin, 7.70mm W X 12.70mm L X 6.60mm H body, IPC Medium Density"
height 6.6
pads (8):
  rect 2.3x1 smd: 1(-4.7,3.81) 3(-4.7,1.27) 5(-4.7,-1.27) 7(-4.7,-3.81) 8(4.7,-3.81) 10(4.7,-1.27) 12(4.7,1.27) 14(4.7,3.81)
Top Overlay:
  circle w0.25: c-5.725,4.9 r0.125
  circle w0.5: c-2.325,5.35 r0.25
  lines w0.2: -3.2,-6.35 -3.2,6.35 3.2,6.35 3.2,-6.35 -3.2,-6.35
Mechanical 14:
  circle w0.1: c-2.85,5.35 r0.5
  lines w0.1: -3.85,-6.35 -3.85,6.35 3.85,6.35 3.85,-6.35 -3.85,-6.35
Mechanical 15:
  lines w0.05: -0.5,0 0.5,0 ; 0,-0.5 0,0.5 ; -6.2,-6.75 -6.2,6.75 6.2,6.75 6.2,-6.75 -6.2,-6.75
3D body "DCDC_MURATA_NTE.stp": height 6.6, standoff 0, extent -5.626,-6.475 5.626,6.475

## DCDC_PICO_SMV [mil] "SMV Series, SMD DC/DC Converter,  Body 12.7x12.7mm"
height 439.76
pads (5):
  rect 130x60 smd: 1(-272.5,-175) 2(-272.5,175) 3(272.5,175) 4(272.5,0) 5(272.5,-175)
Top Overlay:
  circle w19.68: c-303.15,-237.21 r9.84
  lines w7.87: -250,-220.75 -250,-250 250,-250 250,-220.75 ; -250,-129.25 -250,129.25 ; -250,220.75 -250,250 250,250 250,220.75 ; 250,-129.25 250,-45.75 ; 250,45.75 250,129.25
  text "IN+" at -185.48,-195.28 h39.37
  text "IN-" at -185.48,154.72 h39.37
  text "OUT-" at 31.05,157.68 h39.37
  text "OUT+" at 31.05,-192.32 h39.37
  text "COM" at 65.5,-19.29 h39.37
Mechanical 8:
  lines w3.94: -292.19,-175 -272.5,-175 ; -292.19,175 -272.5,175 ; -272.5,-194.69 -272.5,-175 ; -272.5,-155.31 -272.5,-175 ; -272.5,155.31 -272.5,175 ; -272.5,194.69 -272.5,175 ; -252.82,-175 -272.5,-175 ; -252.82,175 -272.5,175 ; -19.69,0 0,0 ; 0,-19.69 0,0 ; 0,19.69 0,0 ; 19.68,0 0,0 ; 252.82,-175 272.5,-175 ; 252.82,0 272.5,0 ; 252.82,175 272.5,175 ; 272.5,-194.69 272.5,-175 ; 272.5,-155.31 272.5,-175 ; 272.5,-19.69 272.5,0 ; 272.5,19.69 272.5,0 ; 272.5,155.31 272.5,175 ; 272.5,194.69 272.5,175 ; 292.19,-175 272.5,-175 ; 292.19,0 272.5,0 ; 292.19,175 272.5,175 ; -337.5,-205 -207.5,-205 -207.5,-145 -337.5,-145 -337.5,-205 ; -337.5,145 -207.5,145 -207.5,205 -337.5,205 -337.5,145 ; 207.5,-205 337.5,-205 337.5,-145 207.5,-145 207.5,-205 ; 207.5,-30 337.5,-30 337.5,30 207.5,30 207.5,-30 ; 207.5,145 337.5,145 337.5,205 207.5,205 207.5,145
Mechanical 14:
  circle w3.94: c-303.15,-237.21 r19.68
  lines w3.94: -250,-188.39 -310,-188.39 -310,-161.61 -250,-161.61 ; -250,161.61 -310,161.61 -310,188.39 -250,188.39 ; 250,-188.39 310,-188.39 310,-161.61 250,-161.61 ; 250,-13.39 310,-13.39 310,13.39 250,13.39 ; 250,161.61 310,161.61 310,188.39 250,188.39 ; -250,-250 250,-250 250,250 -250,250 -250,-250
  text "IN+" at -185.48,-195.28 h39.37
  text "IN-" at -185.48,154.72 h39.37
  text "OUT-" at 31.05,157.68 h39.37
  text "OUT+" at 31.05,-192.32 h39.37
  text "COM" at 65.5,-19.29 h39.37
Mechanical 15:
  lines w1.97: -347.34,-259.84 -347.34,259.84 347.34,259.84 347.34,-259.84 -347.34,-259.84
3D body "DCDC_PICO_SMV.stp": height 440, standoff 0, extent -310,-250 310,250

## DCDC_RECOM_R2D [mm] "R2D Series 6 Pin of 10 SMD Package Version, DC/DC Converter,  Body 10.7X15.24mm"
height 9
pads (6):
  rect 1.8x1.2 smd: 1(-5.1,5.08) 2(-5.1,2.54) 4(-5.1,-2.54) 5(-5.1,-5.08) 7(5.1,-2.54) 10(5.1,5.08)
Top Overlay:
  circle w0.5: c-6.85,5.125 r0.25
  lines w0.2: -5.35,-6.03 -5.35,-7.62 5.35,-7.62 5.35,-3.49 ; -5.35,-4.13 -5.35,-3.49 ; -5.35,-1.59 -5.35,1.59 ; -5.35,3.49 -5.35,4.13 ; -5.35,6.03 -5.35,7.62 5.35,7.62 5.35,6.03 ; 5.35,-1.59 5.35,4.13
Mechanical 8:
  lines w0.1: -5.6,-5.08 -5.1,-5.08 ; -5.6,-2.54 -5.1,-2.54 ; -5.6,2.54 -5.1,2.54 ; -5.6,5.08 -5.1,5.08 ; -5.1,-5.58 -5.1,-5.08 ; -5.1,-4.58 -5.1,-5.08 ; -5.1,-3.04 -5.1,-2.54 ; -5.1,-2.04 -5.1,-2.54 ; -5.1,2.04 -5.1,2.54 ; -5.1,3.04 -5.1,2.54 ; -5.1,4.58 -5.1,5.08 ; -5.1,5.58 -5.1,5.08 ; -4.6,-5.08 -5.1,-5.08 ; -4.6,-2.54 -5.1,-2.54 ; -4.6,2.54 -5.1,2.54 ; -4.6,5.08 -5.1,5.08 ; -0.5,0 0,0 ; 0,-0.5 0,0 ; 0,0.5 0,0 ; 0.5,0 0,0 ; 4.6,-2.54 5.1,-2.54 ; 4.6,5.08 5.1,5.08 ; 5.1,-3.04 5.1,-2.54 ; 5.1,-2.04 5.1,-2.54 ; 5.1,4.58 5.1,5.08 ; 5.1,5.58 5.1,5.08 ; 5.6,-2.54 5.1,-2.54 ; 5.6,5.08 5.1,5.08 ; -6,-5.68 -4.2,-5.68 -4.2,-4.48 -6,-4.48 -6,-5.68 ; -6,-3.14 -4.2,-3.14 -4.2,-1.94 -6,-1.94 -6,-3.14 ; -6,1.94 -4.2,1.94 -4.2,3.14 -6,3.14 -6,1.94 ; -6,4.48 -4.2,4.48 -4.2,5.68 -6,5.68 -6,4.48 ; 4.2,-3.14 6,-3.14 6,-1.94 4.2,-1.94 4.2,-3.14 ; 4.2,4.48 6,4.48 6,5.68 4.2,5.68 4.2,4.48
Mechanical 14:
  circle w0.1: c-3.65,6.1 r0.5
  lines w0.1: -5.35,-5.33 -5.55,-5.33 -5.55,-4.83 -5.35,-4.83 ; -5.35,-2.79 -5.55,-2.79 -5.55,-2.29 -5.35,-2.29 ; -5.35,2.29 -5.55,2.29 -5.55,2.79 -5.35,2.79 ; -5.35,4.83 -5.55,4.83 -5.55,5.33 -5.35,5.33 ; 5.35,-2.79 5.55,-2.79 5.55,-2.29 5.35,-2.29 ; 5.35,4.83 5.55,4.83 5.55,5.33 5.35,5.33 ; -5.35,-7.62 -5.35,7.62 5.35,7.62 5.35,-7.62 -5.35,-7.62
Mechanical 15:
  lines w0.05: -6.25,-7.87 -6.25,7.87 6.25,7.87 6.25,-7.87 -6.25,-7.87
3D body "DCDC_RECOM_R2D.stp": height 9, standoff 0, extent -5.55,-7.62 5.55,7.62

## DCDC_TRACO_TDR2SM [mm] "TDR 2SM Series, SMD DC/DC Converter,  Body 18.9x12.8mm"
height 9.2
pads (7):
  rect 2x1.8 smd: 1(-8.05,7.62) 2(-8.05,5.08) 6(-8.05,-5.08) 7(-8.05,-7.62) 8(8.05,-7.62) 9(8.05,-5.08) 14(8.05,7.62)
Top Overlay:
  circle w0.5: c-8.225,9.425 r0.25
  circle w0.5: c-4.6,7.625 r0.25
  lines w0.2: -6.65,-9.7 -6.65,9.7 6.65,9.7 6.65,-9.7 -6.65,-9.7
Mechanical 8:
  lines w0.1: -8.55,-7.62 -8.05,-7.62 ; -8.55,-5.08 -8.05,-5.08 ; -8.55,5.08 -8.05,5.08 ; -8.55,7.62 -8.05,7.62 ; -8.05,-8.12 -8.05,-7.62 ; -8.05,-7.12 -8.05,-7.62 ; -8.05,-5.58 -8.05,-5.08 ; -8.05,-4.58 -8.05,-5.08 ; -8.05,4.58 -8.05,5.08 ; -8.05,5.58 -8.05,5.08 ; -8.05,7.12 -8.05,7.62 ; -8.05,8.12 -8.05,7.62 ; -7.55,-7.62 -8.05,-7.62 ; -7.55,-5.08 -8.05,-5.08 ; -7.55,5.08 -8.05,5.08 ; -7.55,7.62 -8.05,7.62 ; -0.5,0 0,0 ; 0,-0.5 0,0 ; 0,0.5 0,0 ; 0.5,0 0,0 ; 7.55,-7.62 8.05,-7.62 ; 7.55,-5.08 8.05,-5.08 ; 7.55,7.62 8.05,7.62 ; 8.05,-8.12 8.05,-7.62 ; 8.05,-7.12 8.05,-7.62 ; 8.05,-5.58 8.05,-5.08 ; 8.05,-4.58 8.05,-5.08 ; 8.05,7.12 8.05,7.62 ; 8.05,8.12 8.05,7.62 ; 8.55,-7.62 8.05,-7.62 ; 8.55,-5.08 8.05,-5.08 ; 8.55,7.62 8.05,7.62 ; -9.05,-8.52 -9.05,-6.72 -7.05,-6.72 -7.05,-8.52 -9.05,-8.52 ; -9.05,-5.98 -9.05,-4.18 -7.05,-4.18 -7.05,-5.98 -9.05,-5.98 ; -9.05,4.18 -9.05,5.98 -7.05,5.98 -7.05,4.18 -9.05,4.18 ; -9.05,6.72 -9.05,8.52 -7.05,8.52 -7.05,6.72 -9.05,6.72 ; 7.05,-8.52 7.05,-6.72 9.05,-6.72 9.05,-8.52 7.05,-8.52 ; 7.05,-5.98 7.05,-4.18 9.05,-4.18 9.05,-5.98 7.05,-5.98 ; 7.05,6.72 7.05,8.52 9.05,8.52 9.05,6.72 7.05,6.72
Mechanical 14:
  circle w0.1: c-4.6,7.625 r0.5
  lines w0.1: -6.65,-9.7 -6.65,9.7 6.65,9.7 6.65,-9.7 -6.65,-9.7
Mechanical 15:
  lines w0.05: -9.3,-9.95 9.3,-9.95 9.3,9.95 -9.3,9.95 -9.3,-9.95
3D body "DCDC_TRACO_TDR2SM.stp": height 8.29, standoff 0, extent -8.6,-9.45 8.6,9.45

## DCDC_TRACO_TES1-XX1X [mm] "TES 1 Series, Single Output DC/DC Converter,  Body 13.7x8mm"
height 7.25
pads (5):
  rect 1.6x1 smd: 1(-5,3.81) 3(-5,1.27) 7(-5,-3.81) 8(5,-3.81) 14(5,3.81)
Top Overlay:
  circle w0.25: c-5,5 r0.125
  circle w0.5: c-3.125,5.975 r0.25
  lines w0.2: -4.125,-4.81 -4.125,-6.975 4.125,-6.975 4.125,-4.81 ; -4.125,-2.81 -4.125,0.27 ; -4.125,2.27 -4.125,2.81 ; -4.125,4.81 -4.125,6.975 4.125,6.975 4.125,4.81 ; 4.125,-2.81 4.125,2.81
  text "+" at 2.59,-4.31 h1
  text "-" at -3.5,-4.31 h1
  text "+" at -3.5,0.77 h1
  text "-" at -3.5,3.31 h1
  text "Vout" at -1.436,-4.31 h1
  text "Vin" at -1.436,2.04 h1
Mechanical 8:
  lines w0.05: -5.5,-3.81 -5,-3.81 ; -5.5,1.27 -5,1.27 ; -5.5,3.81 -5,3.81 ; -5,-4.31 -5,-3.81 ; -5,-3.31 -5,-3.81 ; -5,0.77 -5,1.27 ; -5,1.77 -5,1.27 ; -5,3.31 -5,3.81 ; -5,4.31 -5,3.81 ; -4.5,-3.81 -5,-3.81 ; -4.5,1.27 -5,1.27 ; -4.5,3.81 -5,3.81 ; -0.5,0 0,0 ; 0,-0.5 0,0 ; 0,0.5 0,0 ; 0.5,0 0,0 ; 4.5,-3.81 5,-3.81 ; 4.5,3.81 5,3.81 ; 5,-4.31 5,-3.81 ; 5,-3.31 5,-3.81 ; 5,3.31 5,3.81 ; 5,4.31 5,3.81 ; 5.5,-3.81 5,-3.81 ; 5.5,3.81 5,3.81
Mechanical 14:
  circle w0.1: c-3.125,5.975 r0.5
  lines w0.1: -4.125,-6.975 4.125,-6.975 4.125,6.975 -4.125,6.975 -4.125,-6.975
  text "Vin" at -1.436,2.04 h1
  text "Vout" at -1.436,-4.31 h1
  text "-" at -3.5,3.31 h1
  text "+" at -3.5,0.77 h1
  text "-" at -3.5,-4.31 h1
  text "+" at 2.59,-4.31 h1
Mechanical 15:
  lines w0.05: -6.05,-7.225 -6.05,7.225 6.05,7.225 6.05,-7.225 -6.05,-7.225
3D body "DCDC_TRACO_TES1-xx1x.stp": height 7.25, standoff 0, extent -5.6,-6.975 5.6,6.975

## DCDC_TRACO_TES3WI [mm] "TES 3 WI Series, 2.54mm Pitch, 12 Pin of 24, Boby 14.8 W X 32.3mm L X 10.45mm H"
height 10.45
pads (12):
  rect 2.25x1.2 smd: 1(-8.75,13.97) 2(-8.75,11.43) 3(-8.75,8.89) 10(-8.75,-8.89) 11(-8.75,-11.43) 12(-8.75,-13.97) 13(8.75,-13.97) 14(8.75,-11.43) 15(8.75,-8.89) 22(8.75,8.89) 23(8.75,11.43) 24(8.75,13.97)
Top Overlay:
  circle w0.25: c-9.6,15.1 r0.125
  circle w0.5: c-6.3,15.15 r0.25
  lines w0.2: -7.3,-16.15 -7.3,16.15 7.3,16.15 7.3,-16.15 -7.3,-16.15
Mechanical 14:
  circle w0.1: c-6.4,15.15 r0.5
  lines w0.1: -7.4,-16.15 -7.4,16.15 7.4,16.15 7.4,-16.15 -7.4,-16.15
Mechanical 15:
  lines w0.05: -0.5,0 0.5,0 ; 0,-0.5 0,0.5 ; -10.15,-16.55 -10.15,16.55 10.15,16.55 10.15,-16.55 -10.15,-16.55
3D body "DCDC_TRACO_TES3WI.stp": height 10.45, standoff 0, extent -9.4,-16.15 9.4,16.15